# Altium footprint library DrPCB.PcbLib: 910 footprints (part 38 of 57)
Each footprint in its own frame and in the unit in brackets; x right, y up, seen from the top. Pads: shape width x height; smd on the part's side, far side on the other; paste and mask are expansions set on the pad; w line width, h text height; cw(c..) or ccw(c..) is an arc to the next point about the centre after c.
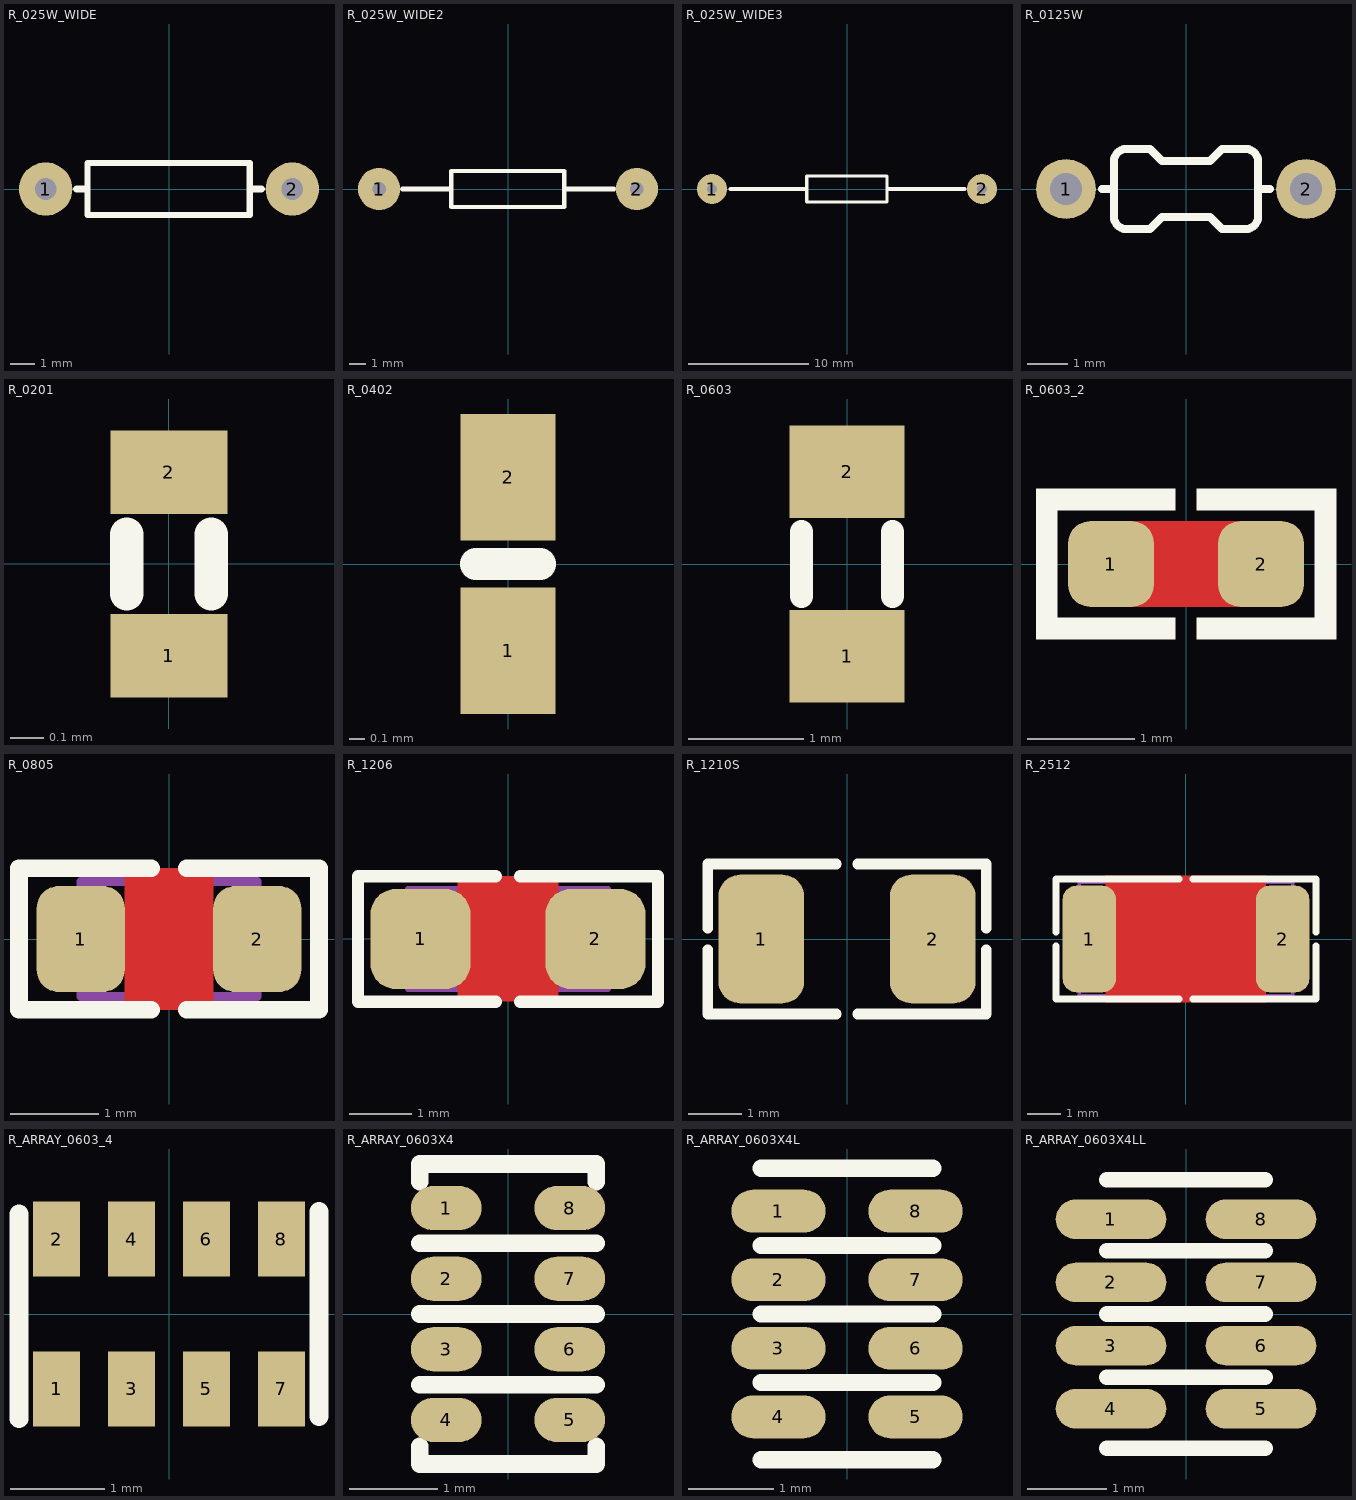
[diagram p37: the footprints below, top view; thin cyan lines are the x and y axes]

## R_025W_WIDE [mm]
pads (2):
  round 2.2 hole 0.9: 1(-5.08,0) 2(5.08,0)
Top Overlay:
  lines w0.254: -3.353,-1.067 -3.353,1.067 3.327,1.067 3.327,-1.067 -3.353,-1.067
  lines w0.3: -3.81,0 -3.391,0 ; 3.378,0 3.797,0
3D body "User Library-Res40-Axial 0_25W-1K.step": height 2.41, standoff -2, extent -5.383,-1.2 5.377,1.2

## R_025W_WIDE2 [mm]
pads (2):
  round 2.5 hole 0.8: 1(-7.62,0) 2(7.62,0)
Top Overlay:
  lines w0.254: -3.353,-1.067 -3.353,1.067 3.327,1.067 3.327,-1.067 -3.353,-1.067
  lines w0.3: -6.236,0 -3.391,0 ; 3.378,0 6.261,0

## R_025W_WIDE3 [mm]
pads (2):
  round 2.5 hole 0.8: 1(-11.25,0) 2(11.25,0)
Top Overlay:
  lines w0.254: -3.353,-1.067 -3.353,1.067 3.327,1.067 3.327,-1.067 -3.353,-1.067
  lines w0.3: -9.716,0 -3.391,0 ; 3.378,0 9.792,0

## R_0125W [mm] "RESISTOR 1/8 WATT, AXIAL0.25"
pads (2):
  round 1.5 hole 0.8: 1(-3,0) 2(3,0)
Top Overlay:
  lines w0.2: -2.1,0 -1.8,0 ; 1.8,0 2.1,0 ; -1.8,-0.7 ccw(c-1.5,-0.7) -1.5,-1 -0.9,-1 -0.6,-0.7 0.6,-0.7 0.9,-1 1.5,-1 ccw(c1.5,-0.7) 1.8,-0.7 1.8,0.7 ccw(c1.5,0.7) 1.5,1 0.9,1 0.6,0.7 -0.6,0.7 -0.9,1 -1.5,1 ccw(c-1.5,0.7) -1.8,0.7 -1.8,-0.7
3D body "User Library-Res_1-8w_1_0.step": height 1.9, standoff -2, extent -3.2,-0.9 3.2,0.9

## R_0201 [mm]
pads (2):
  rect 0.35x0.25 smd mask+0.05: 1(0,-0.275) 2(0,0.275)
Top Overlay:
  lines w0.1: -0.127,-0.089 -0.127,0.089 ; 0.127,-0.089 0.127,0.089
3D body "User Library-User Library-RES0201.step": height 0.16, standoff 0.01, extent -0.15,-0.3 0.15,0.3

## R_0402 [mm]
pads (2):
  rect 0.6x0.8 smd: 1(0,-0.55) 2(0,0.55)
Top Overlay:
  lines w0.2: -0.203,0 0.203,0
3D body "User Library-SMD RESISTOR-1.step": height 0.36, standoff 0.01, extent -0.25,-0.5 0.25,0.5

## R_0603 [mm]
pads (2):
  rect 1x0.8 smd paste-1: 1(0,-0.8) 2(0,0.8)
Top Overlay:
  lines w0.2: -0.394,-0.279 -0.394,0.279 ; 0.394,-0.279 0.394,0.279
Top Paste:
  region: -0.35,0.8 -0.35,0.73 -0.297,0.602 -0.198,0.503 -0.07,0.45 0,0.45 0.07,0.45 0.198,0.503 0.297,0.602 0.35,0.73 0.35,0.8 0.35,1 0.35,1.03 0.327,1.085 0.285,1.127 0.23,1.15 0.2,1.15 -0.2,1.15 -0.23,1.15 -0.285,1.127 -0.327,1.085 -0.35,1.03 -0.35,1
  region: -0.35,-0.8 -0.35,-0.73 -0.297,-0.602 -0.198,-0.503 -0.07,-0.45 0,-0.45 0.07,-0.45 0.198,-0.503 0.297,-0.602 0.35,-0.73 0.35,-0.8 0.35,-1 0.35,-1.03 0.327,-1.085 0.285,-1.127 0.23,-1.15 0.2,-1.15 -0.2,-1.15 -0.23,-1.15 -0.285,-1.127 -0.327,-1.085 -0.35,-1.03 -0.35,-1
3D body "R0603_10k.step": height 0.43, standoff 0.01, extent -0.4,-0.8 0.4,0.8

## R_0603_2 [mm] "CHIP Resistor 1/10 WATT, 1.6x0.8mm, 0603, OPTIMIZED"
height 0.6
pads (2):
  rrect50% 0.8x0.8 smd paste-5 mask+0.075: 1(-0.7,0) 2(0.7,0)
Top Layer:
  pour cut-out: -0.5,0.4 0.5,0.4 0.5,-0.4 -0.5,-0.4
Top Overlay:
  region: 0.1,-0.5 0.1,-0.7 1.4,-0.7 1.4,-0.5
  region: 0.1,0.5 0.1,0.7 1.4,0.7 1.4,0.5
  region: 1.4,0.7 1.2,0.7 1.2,-0.7 1.4,-0.7
  region: -1.4,0.7 -1.2,0.7 -1.2,-0.7 -1.4,-0.7
  region: -0.1,0.5 -0.1,0.7 -1.4,0.7 -1.4,0.5
  region: -0.1,-0.5 -0.1,-0.7 -1.4,-0.7 -1.4,-0.5
Top Paste:
  region: -0.7,0.35 -0.63,0.35 -0.502,0.297 -0.403,0.198 -0.35,0.07 -0.35,0 -0.35,-0.07 -0.403,-0.198 -0.502,-0.297 -0.63,-0.35 -0.7,-0.35 -0.9,-0.35 -0.93,-0.35 -0.985,-0.327 -1.027,-0.285 -1.05,-0.23 -1.05,-0.2 -1.05,0.2 -1.05,0.23 -1.027,0.285 -0.985,0.327 -0.93,0.35 -0.9,0.35
  region: 0.7,0.35 0.63,0.35 0.502,0.297 0.403,0.198 0.35,0.07 0.35,0 0.35,-0.07 0.403,-0.198 0.502,-0.297 0.63,-0.35 0.7,-0.35 0.9,-0.35 0.93,-0.35 0.985,-0.327 1.027,-0.285 1.05,-0.23 1.05,-0.2 1.05,0.2 1.05,0.23 1.027,0.285 0.985,0.327 0.93,0.35 0.9,0.35
3D body "User Library-RES_1609-0603.step": height 0.56, standoff 0, extent -0.85,-0.4 0.85,0.4

## R_0805 [mm] "CHIP RESISTOR 1/8 WATT ,2.0X1.3mm, 0805, 2012"
pads (2):
  rrect50% 1x1.2 smd paste-5 mask+0.075: 1(-1,0) 2(1,0)
Top Layer:
  pour cut-out: -0.5,0.8 0.5,0.8 0.5,-0.8 -0.5,-0.8
Top Overlay:
  lines w0.2: -0.2,-0.8 -1.7,-0.8 -1.7,0.8 -0.2,0.8 ; 0.2,-0.8 1.7,-0.8 1.7,0.8 0.2,0.8
Top Paste:
  region: 0.9,0.5 0.82,0.5 0.673,0.439 0.561,0.327 0.5,0.18 0.5,0.1 0.5,-0.1 0.5,-0.18 0.561,-0.327 0.673,-0.439 0.82,-0.5 0.9,-0.5 1.15,-0.5 1.18,-0.5 1.235,-0.477 1.277,-0.435 1.3,-0.38 1.3,-0.35 1.3,0.35 1.3,0.38 1.277,0.435 1.235,0.477 1.18,0.5 1.15,0.5
  region: -0.9,0.5 -0.82,0.5 -0.673,0.439 -0.561,0.327 -0.5,0.18 -0.5,0.1 -0.5,-0.1 -0.5,-0.18 -0.561,-0.327 -0.673,-0.439 -0.82,-0.5 -0.9,-0.5 -1.15,-0.5 -1.18,-0.5 -1.235,-0.477 -1.277,-0.435 -1.3,-0.38 -1.3,-0.35 -1.3,0.35 -1.3,0.38 -1.277,0.435 -1.235,0.477 -1.18,0.5 -1.15,0.5
Mechanical 13:
  lines w0.1: -1,-0.65 1,-0.65 1,0.65 -1,0.65 -1,-0.65
3D body "User Library-RES_2013-0805.step": height 0.76, standoff 0, extent -1.15,-0.675 1.15,0.675

## R_1206 [mm]
pads (2):
  rrect50% 1.6x1.6 smd paste-5 mask+0.075: 1(-1.4,0) 2(1.4,0)
Top Layer:
  pour cut-out: -0.8,1 -0.8,-1 0.8,-1 0.8,1
Top Overlay:
  lines w0.2: -2.4,-1 -0.2,-1 ; -2.4,-1 -2.4,1 -0.2,1 ; 0.2,-1 2.4,-1 ; 0.2,1 2.4,1 2.4,-1
Top Paste:
  region: -1.4,0.7
  region: -1.4,0.7
  region: -1.4,0.7
  region: -1.15,0.7 -1.1,0.7 -1.008,0.662 -0.938,0.592 -0.9,0.5 -0.9,0.45 -0.9,-0.45 -0.9,-0.5 -0.938,-0.592 -1.008,-0.662 -1.1,-0.7 -1.15,-0.7 -1.625,-0.7 -1.68,-0.7 -1.781,-0.658 -1.858,-0.581 -1.9,-0.48 -1.9,-0.425 -1.9,0.45 -1.9,0.5 -1.862,0.592 -1.792,0.662 -1.7,0.7 -1.65,0.7
  region: 1.15,0.7 1.1,0.7 1.008,0.662 0.938,0.592 0.9,0.5 0.9,0.45 0.9,-0.45 0.9,-0.5 0.938,-0.592 1.008,-0.662 1.1,-0.7 1.15,-0.7 1.625,-0.7 1.68,-0.7 1.781,-0.658 1.858,-0.581 1.9,-0.48 1.9,-0.425 1.9,0.45 1.9,0.5 1.862,0.592 1.792,0.662 1.7,0.7 1.65,0.7
  region: 1.4,0.7
  region: 1.4,0.7
  region: 1.4,0.7
Mechanical 13:
  lines w0.1: -1.6,-0.8 1.6,-0.8 1.6,0.8 -1.6,0.8 -1.6,-0.8
3D body "User Library-RES_3216-1206.step": height 0.85, standoff 0, extent -1.675,-0.865 1.675,0.865

## R_1210S [mm] "CHIP RESISTOR 1/2 WATT, Body 3.2x2.5mm,1210, 3225, soldered"
height 0.7
pads (2):
  rrect50% 1.6x2.4 smd paste-0.2 mask+0.075: 1(-1.6,0) 2(1.6,0)
Top Overlay:
  lines w0.2: -2.6,-0.2 -2.6,-1.4 -0.2,-1.4 ; -2.6,0.2 -2.6,1.4 -0.2,1.4 ; 0.2,-1.4 2.6,-1.4 2.6,-0.2 ; 0.2,1.4 2.6,1.4 2.6,0.2
3D body "r1210_Res1.step": height 1.61, standoff 0, extent -2.47,-1.25 2.47,1.25

## R_2512 [mm] "CHIP RESISTOR 1 WATT, 6.4X3.2mm, 2512, 6432"
height 1
pads (2):
  rrect50% 1.6x3.2 smd: 1(-2.9,0) 2(2.9,0)
Top Layer:
  pour cut-out: -2.4,1.9 2.4,1.9 2.4,-1.9 -2.4,-1.9
Top Overlay:
  lines w0.2: -3.9,-0.2 -3.9,-1.8 -0.2,-1.8 ; -3.9,0.2 -3.9,1.8 -0.2,1.8 ; 0.2,-1.8 3.9,-1.8 3.9,-0.2 ; 0.2,1.8 3.9,1.8 3.9,0.2
Mechanical 13:
  lines w0.1: -3.2,-1.7 3.2,-1.7 3.2,1.7 -3.2,1.7 -3.2,-1.7
3D body "User Library-2512 SMD Resistor.step": height 1.6, standoff 0, extent -3.175,-1.5 3.175,1.5

## R_ARRAY_0603_4 [mm]
pads (8):
  rect 0.5x0.8 smd: 1(-1.2,-0.8) 2(-1.2,0.8) 3(-0.4,-0.8) 4(-0.4,0.8) 5(0.4,-0.8) 6(0.4,0.8) 7(1.2,-0.8) 8(1.2,0.8)
Top Overlay:
  lines w0.2: -1.6,-1.118 -1.6,1.067 ; 1.6,-1.092 1.6,1.092
3D body "User Library-Array-1206-4Way-Var1.STEP": height 0.5, standoff 0, extent -1.6,-0.8 1.6,0.8

## R_ARRAY_0603X4 [mm] "RPACK, 0603X4, 160X80X4 1206"
height 0.4
pads (8):
  oval 0.8x0.5 smd paste-0.05: 1(-0.7,1.2) 2(-0.7,0.4) 3(-0.7,-0.4) 4(-0.7,-1.2) 5(0.7,-1.2) 6(0.7,-0.4) 7(0.7,0.4) 8(0.7,1.2)
Top Overlay:
  lines w0.2: -1,-1.5 -1,-1.7 1,-1.7 1,-1.5 ; -1,-0.8 1,-0.8 ; -1,0 1,0 ; -1,0.8 1,0.8 ; -1,1.5 -1,1.7 1,1.7 1,1.5
3D body "User Library-Array-1206-4Way-Var1.STEP": height 0.5, standoff 0, extent -0.8,-1.6 0.8,1.6

## R_ARRAY_0603X4L [mm] "RPACK, 0603X4, 160X80X4 1206"
height 0.4
pads (8):
  oval 1.1x0.5 smd paste-0.05: 1(-0.8,1.2) 2(-0.8,0.4) 3(-0.8,-0.4) 4(-0.8,-1.2) 5(0.8,-1.2) 6(0.8,-0.4) 7(0.8,0.4) 8(0.8,1.2)
Top Overlay:
  lines w0.2: -1,-1.7 1,-1.7 ; -1,-0.8 1,-0.8 ; -1,0 1,0 ; -1,0.8 1,0.8 ; -1,1.7 1,1.7
3D body "User Library-Array-1206-4Way-Var1.STEP": height 0.5, standoff 0, extent -0.8,-1.6 0.8,1.6

## R_ARRAY_0603X4LL [mm] "RPACK, 0603X4, 160X80X4 1206"
height 0.4
pads (8):
  oval 1.4x0.5 smd paste-0.1: 1(-0.95,1.2) 2(-0.95,0.4) 3(-0.95,-0.4) 4(-0.95,-1.2) 5(0.95,-1.2) 6(0.95,-0.4) 7(0.95,0.4) 8(0.95,1.2)
Top Overlay:
  lines w0.2: -1,-1.7 1,-1.7 ; -1,-0.8 1,-0.8 ; -1,0 1,0 ; -1,0.8 1,0.8 ; -1,1.7 1,1.7
3D body "User Library-Array-1206-4Way-Var1.STEP": height 0.5, standoff 0, extent -0.8,-1.6 0.8,1.6